# Altium footprint library Custom1.PcbLib: 554 footprints (part 3 of 35)
Each footprint in its own frame and in the unit in brackets; x right, y up, seen from the top. Pads: shape width x height; smd on the part's side, far side on the other; paste and mask are expansions set on the pad; w line width, h text height; cw(c..) or ccw(c..) is an arc to the next point about the centre after c.
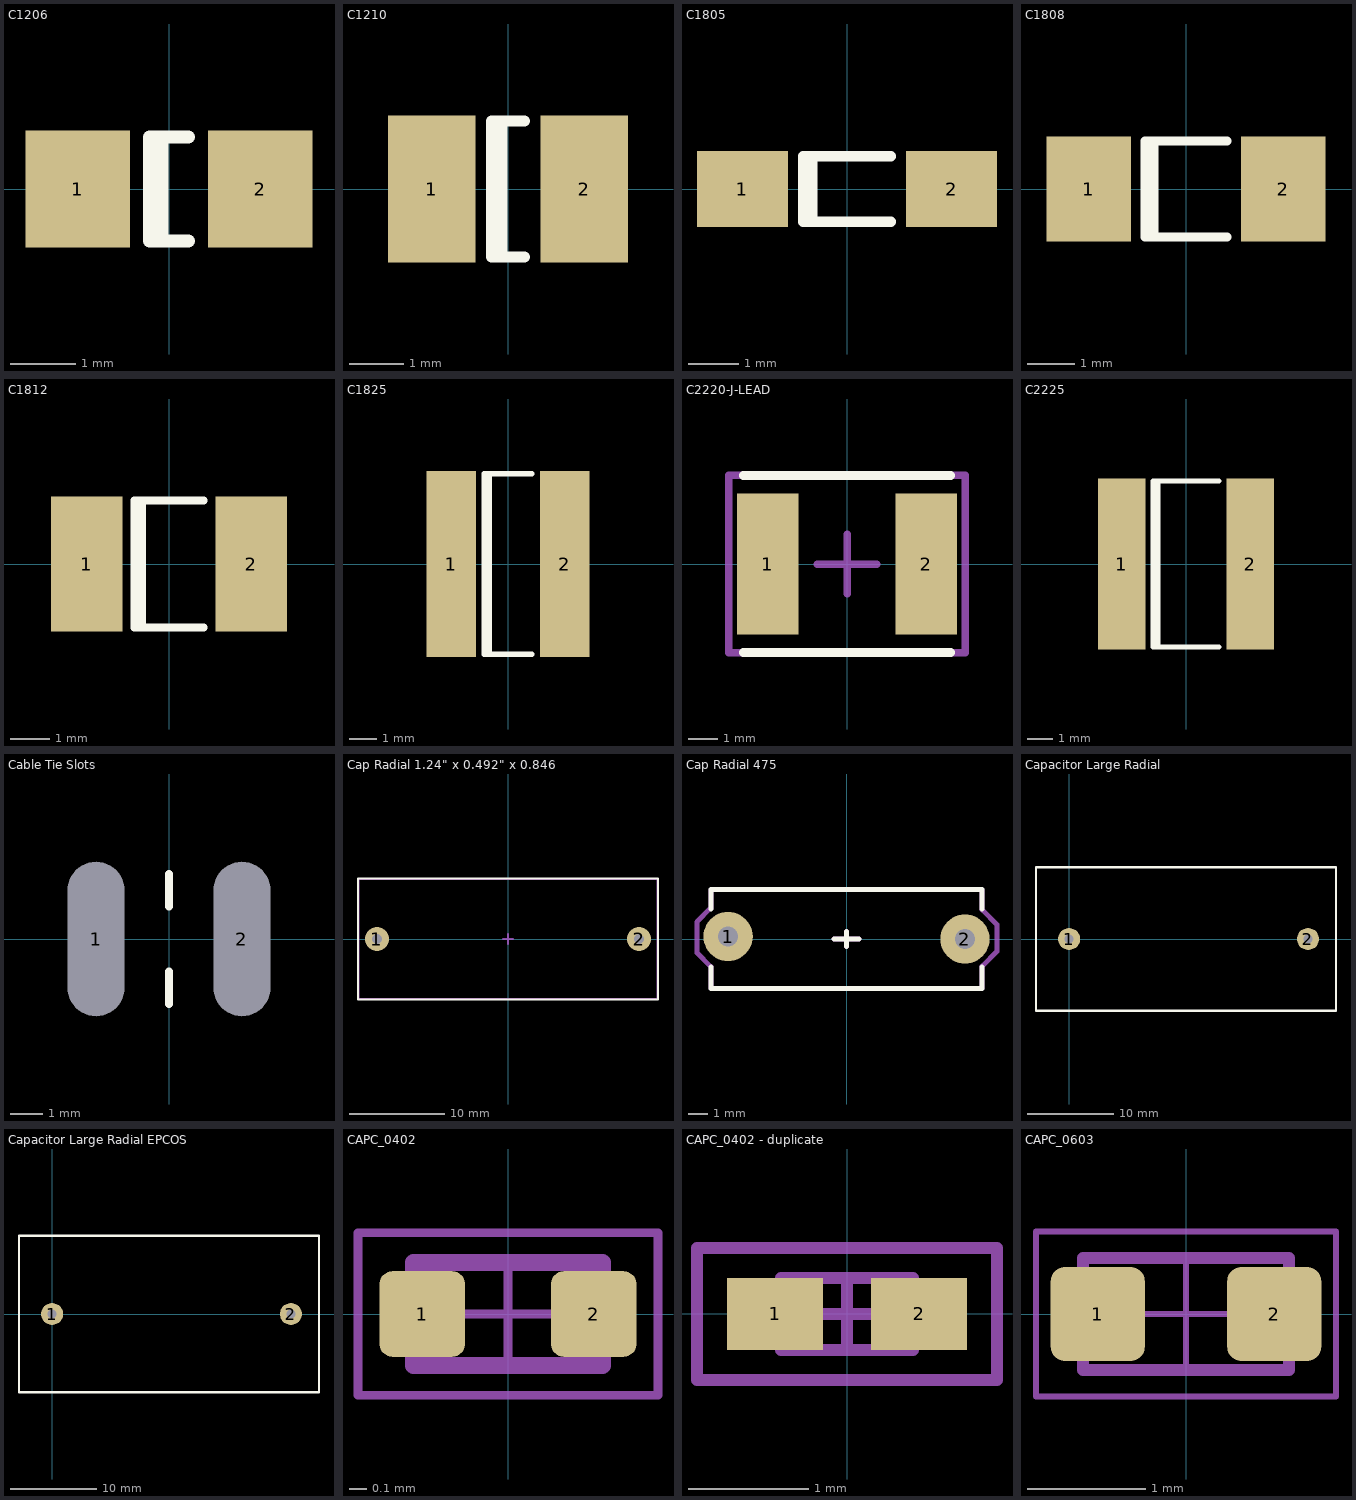
[diagram p2: the footprints below, top view; thin cyan lines are the x and y axes]

## C1206 [mm] "Chip Capacitor; Body 3.2 x 1.6 mm (LxW typ)"
height 1.3
pads (2):
  rect 1.6x1.8 smd: 1(-1.4,0) 2(1.4,0)
Top Overlay:
  lines w0.2: -0.11,-0.8 -0.11,0.8 ; 0.3,-0.8 -0.3,-0.8 -0.3,0.8 0.3,0.8

## C1210 [mm] "Chip Capacitor; Body 3.2 x 2.5 mm (LxW typ)"
height 1.5
pads (2):
  rect 1.6x2.7 smd: 1(-1.4,0) 2(1.4,0)
Top Overlay:
  lines w0.2: -0.11,-1.25 -0.11,1.25 ; 0.3,-1.25 -0.3,-1.25 -0.3,1.25 0.3,1.25

## C1805 [mm] "Chip Capacitor; Body 4.5 x 1.3 mm (LxW typ)"
height 1.4
pads (2):
  rect 1.8x1.5 smd: 1(-2.075,0) 2(2.075,0)
Top Overlay:
  lines w0.2: -0.685,-0.65 -0.685,0.65 ; 0.875,-0.65 -0.875,-0.65 -0.875,0.65 0.875,0.65

## C1808 [mm] "Chip Capacitor; Body 4.5 x 2.0 mm (LxW typ)"
height 2.03
pads (2):
  rect 1.8x2.25 smd: 1(-2.075,0) 2(2.075,0)
Top Overlay:
  lines w0.2: -0.685,-1.025 -0.685,1.025 ; 0.875,-1.025 -0.875,-1.025 -0.875,1.025 0.875,1.025

## C1812 [mm] "Chip Capacitor; Body 4.5 x 3.2 mm (LxW typ)"
height 2.03
pads (2):
  rect 1.8x3.4 smd: 1(-2.075,0) 2(2.075,0)
Top Overlay:
  lines w0.2: -0.685,-1.6 -0.685,1.6 ; 0.875,-1.6 -0.875,-1.6 -0.875,1.6 0.875,1.6

## C1825 [mm] "Chip Capacitor; Body 4.5 x 6.4 mm (LxW typ)"
height 2.03
pads (2):
  rect 1.8x6.8 smd: 1(-2.075,0) 2(2.075,0)
Top Overlay:
  lines w0.2: -0.685,-3.3 -0.685,3.3 ; 0.875,-3.3 -0.875,-3.3 -0.875,3.3 0.875,3.3

## C2220-J-LEAD [mm] "Stacked Chip Capacitor; Body 6.0 x 5.0 mm (LxW typ)"
height 5
pads (2):
  rect 2.08x4.78 smd: 1(-2.69,0) 2(2.69,0)
Top Overlay:
  lines w0.3: -3.5,-3 3.5,-3 ; -3.5,3 3.5,3
Mechanical 15:
  lines w0.254: -1,0 1,0 ; 0,-1 0,1 ; -4,-3 4,-3 4,3 -4,3 -4,-3

## C2225 [mm] "Chip Capacitor; Body 5.6 x 6.4 mm (LxW typ)"
height 2.03
pads (2):
  rect 1.9x6.8 smd: 1(-2.55,0) 2(2.55,0)
Top Overlay:
  lines w0.2: -1.11,-3.3 -1.11,3.3 ; 1.3,-3.3 -1.3,-3.3 -1.3,3.3 1.3,3.3

## Cable Tie Slots [mil] "Anchor Slots for Cable Ties"
pads (2):
  round 60 hole 70 slot 190 at 90 deg unplated mask+4: 1(-90,0) 2(90,0)
Top Overlay:
  lines w10: 0,-80 0,-40 ; 0,40 0,80
3D body: height 125, standoff 0, extent -60,-85.5 60,85.5

## Cap Radial 1.24" x 0.492" x 0.846 [mil]
height 846
pads (2):
  round 100 hole 40: 1(-541.5,0) 2(541.5,0)
Top Overlay:
  lines w10: -620,-250 620,-250 620,250 -620,250 -620,-250
Mechanical 15:
  lines w10: -19.68,0 19.68,0 ; 0,-19.68 0,19.68 ; -618.11,-248.03 -618.11,248.03 618.11,248.03 618.11,-248.03 -618.11,-248.03
3D body: height 846, standoff 20, extent -616.5,-245 618.5,245

## Cap Radial 475 [mil]
pads (2):
  round 100 hole 40: 1(-240,5) 2(240,0)
Top Overlay:
  lines w10: -275,-57 -275,-100 275,-100 275,-57 ; -275,61 -275,100 275,100 275,61 ; -25,0 25,0 ; 0,-15 0,15
Mechanical 15:
  lines w10: -25,0 25,0 ; 0,-15 0,15 ; -303,-28 -303,-12.25 -303,19.25 -303,35 -275,63 -275,100 275,100 275,59 305,29 305,-25 275,-55 275,-100 -275,-100 -275,-56 -303,-28
3D body: height 500, standoff 10, extent -275,-100 275,100

## Capacitor Large Radial [mil]
pads (2):
  round 100 hole 40: 1(0,0) 2(1083,0)
Top Overlay:
  lines w10: -150,-325 -150,325 1210,325 1210,-325 -150,-325
3D body: height 1083, standoff 20, extent -150,-325 1210,325

## Capacitor Large Radial EPCOS [mil]
pads (2):
  round 100 hole 40: 1(0,0) 2(1082.68,0)
Top Overlay:
  lines w10: -150,-355 1210,-355 1210,355 -150,355 -150,-355
3D body: height 846.46, standoff 20, extent -150,-350 1210,350

## CAPC_0402 [mm] "Chip Capacitor, Body 1.0x0.5mm, IPC Medium Density"
height 0.6
pads (2):
  rrect30% 0.5x0.5 smd: 1(-0.5,0) 2(0.5,0)
Mechanical 13:
  lines w0.1: -0.55,-0.3 0.55,-0.3 0.55,0.3 -0.55,0.3 -0.55,-0.3
Mechanical 15:
  lines w0.05: -0.3,0 0.3,0 ; 0,-0.3 0,0.3 ; -0.875,-0.475 0.875,-0.475 0.875,0.475 -0.875,0.475 -0.875,-0.475
3D body: height 0.6, standoff 0, extent -0.55,-0.3 0.55,0.3

## CAPC_0402 - duplicate [mm] "Chip Capacitor, Body 1.0x0.5mm, IPC Medium Density"
height 0.6
pads (2):
  rect 0.8x0.6 smd: 1(-0.6,0) 2(0.6,0)
Mechanical 13:
  lines w0.1: -0.55,-0.3 0.55,-0.3 0.55,0.3 -0.55,0.3 -0.55,-0.3
Mechanical 15:
  lines w0.1: -0.3,0 0.3,0 ; 0,-0.3 0,0.3 ; -1.25,-0.55 1.25,-0.55 1.25,0.55 -1.25,0.55 -1.25,-0.55
3D body: height 0.6, standoff 0, extent -0.55,-0.3 0.55,0.3

## CAPC_0603 [mm] "Chip Capacitor, Body 1.6x0.8mm, IPC Medium Density"
height 0.85
pads (2):
  rrect30% 0.8x0.8 smd: 1(-0.75,0) 2(0.75,0)
Mechanical 13:
  lines w0.1: -0.875,-0.475 -0.875,0.475 0.875,0.475 0.875,-0.475 -0.875,-0.475
Mechanical 15:
  lines w0.05: -0.475,0 0.475,0 ; 0,-0.475 0,0.475 ; -1.275,-0.7 -1.275,0.7 1.275,0.7 1.275,-0.7 -1.275,-0.7
3D body: height 0.85, standoff 0, extent -0.875,-0.475 0.875,0.475